# Altium footprint library PcbLib1.PcbLib: 1009 footprints (part 62 of 64)
Each footprint in its own frame and in the unit in brackets; x right, y up, seen from the top. Pads: shape width x height; smd on the part's side, far side on the other; paste and mask are expansions set on the pad; w line width, h text height; cw(c..) or ccw(c..) is an arc to the next point about the centre after c.
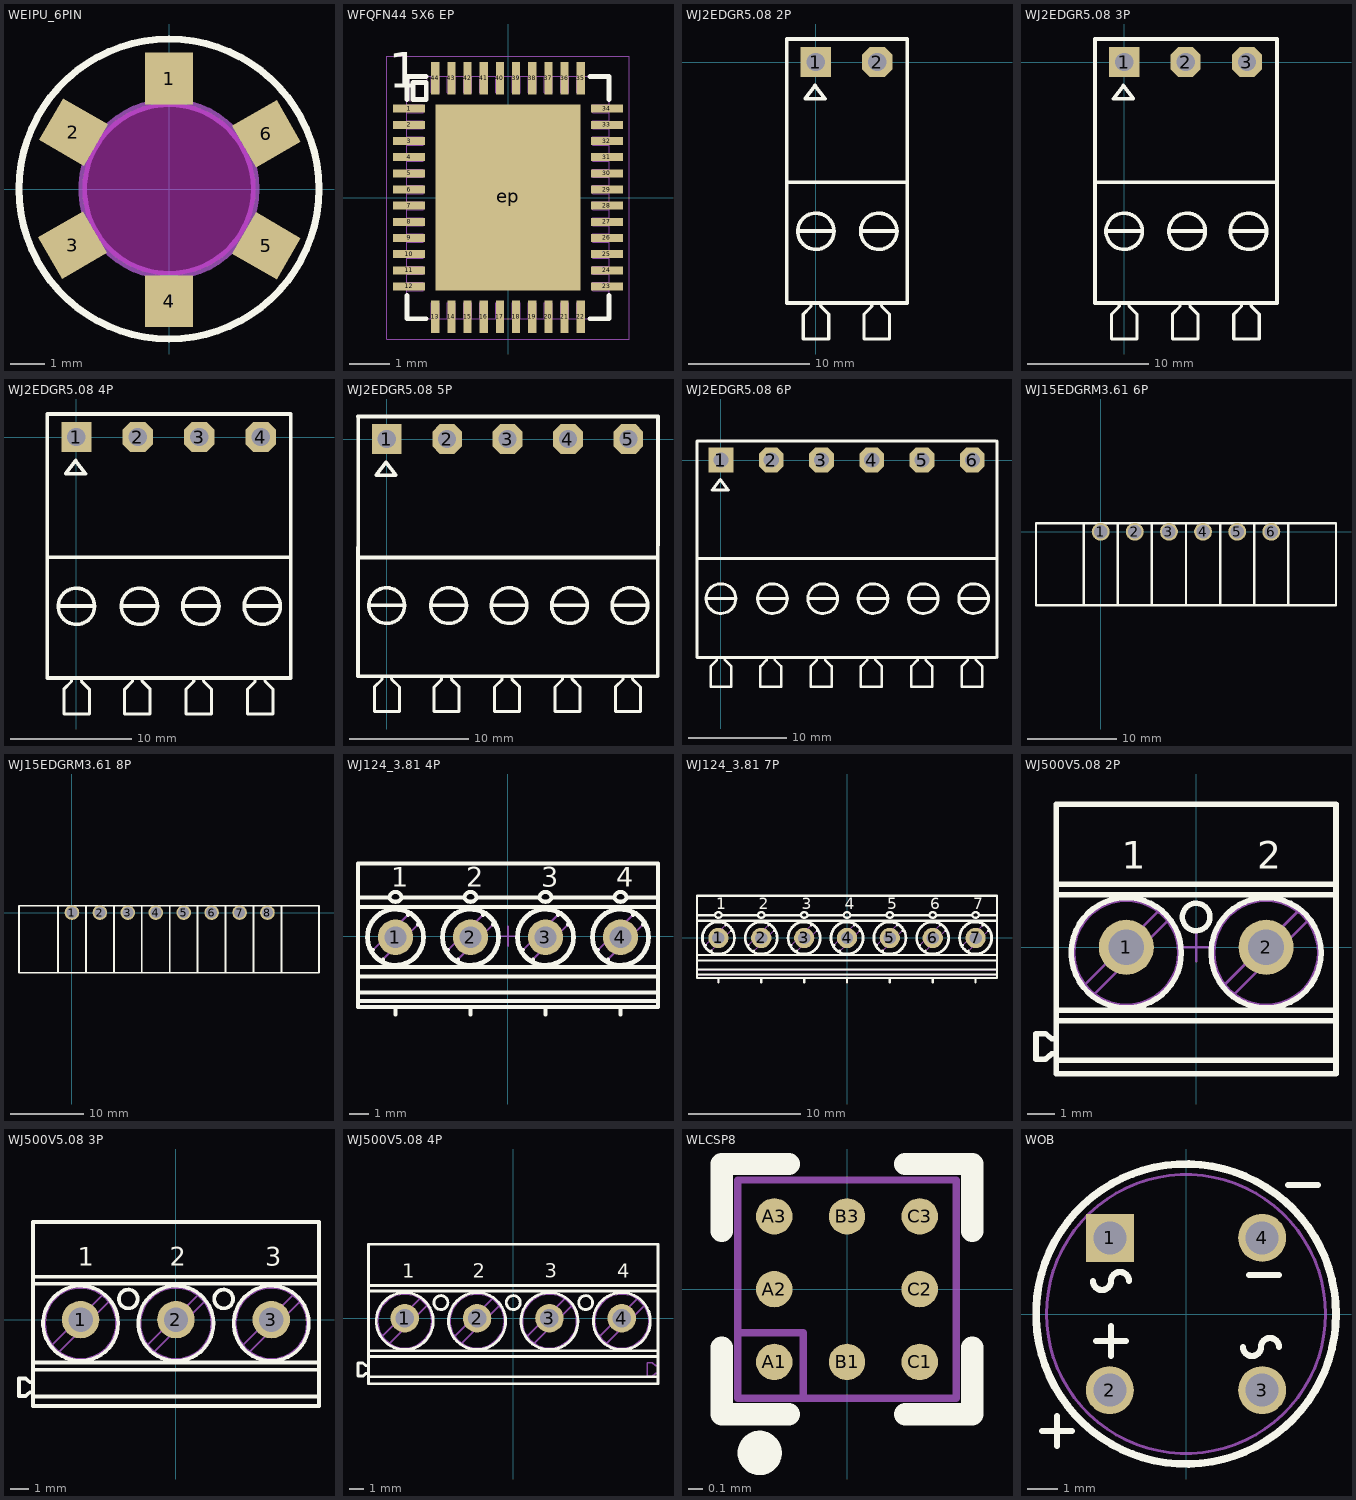
[diagram p61: the footprints below, top view; thin cyan lines are the x and y axes]

## WEIPU_6PIN [mm]
pads (6):
  rect 1.4x1.5 smd mask+0.051: 1(0,3.2) 4(0,-3.251)
  rect 1.4x1.5 smd rot 60 mask+0.051: 2(-2.769,1.651) 5(2.819,-1.651)
  rect 1.4x1.5 smd rot 120 mask+0.051: 3(-2.794,-1.626) 6(2.819,1.6)
Top Overlay:
  circle w0.203: c0,0 r4.347
Keep-Out Layer:
  board cut-out: 0,-2.5 -0.246,-2.5 -0.729,-2.404 -1.184,-2.215 -1.594,-1.942 -1.942,-1.594 -2.215,-1.184 -2.404,-0.729 -2.5,-0.246 -2.5,0 -2.5,0.246 -2.404,0.729 -2.215,1.184 -1.942,1.594 -1.594,1.942 -1.184,2.215 -0.729,2.404 -0.246,2.5 0,2.5 0.246,2.5 0.729,2.404 1.184,2.215 1.594,1.942 1.942,1.594 2.215,1.184 2.404,0.729 2.5,0.246 2.5,0 2.5,-0.246 2.404,-0.729 2.215,-1.184 1.942,-1.594 1.594,-1.942 1.184,-2.215 0.729,-2.404 0.246,-2.5
Mechanical 1:
  circle w0.254: c0,0 r2.5

## WFQFN44 5X6 EP [mm]
pads (45):
  rect 0.8x0.2 smd mask+0.05: 1(-2.45,2.2) 2(-2.45,1.8) 3(-2.45,1.4) 4(-2.45,1) 5(-2.45,0.6) 6(-2.45,0.2) 7(-2.45,-0.2) 8(-2.45,-0.6) 9(-2.45,-1) 10(-2.45,-1.4) 11(-2.45,-1.8) 12(-2.45,-2.2) 23(2.45,-2.2) 24(2.45,-1.8) 25(2.45,-1.4) 26(2.45,-1) 27(2.45,-0.6) 28(2.45,-0.2) 29(2.45,0.2) 30(2.45,0.6) 31(2.45,1) 32(2.45,1.4) 33(2.45,1.8) 34(2.45,2.2)
  rect 0.2x0.8 smd mask+0.05: 13(-1.8,-2.95) 14(-1.4,-2.95) 15(-1,-2.95) 16(-0.6,-2.95) 17(-0.2,-2.95) 18(0.2,-2.95) 19(0.6,-2.95) 20(1,-2.95) 21(1.4,-2.95) 22(1.8,-2.95) 35(1.8,2.95) 36(1.4,2.95) 37(1,2.95) 38(0.6,2.95) 39(0.2,2.95) 40(-0.2,2.95) 41(-0.6,2.95) 42(-1,2.95) 43(-1.4,2.95) 44(-1.8,2.95)
  rect 3.6x4.6 smd paste-1.8 mask+0.05: ep(0,0)
Top Overlay:
  lines w0.12: -2.5,-2.425 -2.5,-3 -2.025,-3 ; -2.5,2.425 -2.5,3 -2.025,3 ; 2.025,-3 2.5,-3 2.5,-2.425 ; 2.025,3 2.5,3 2.5,2.425 ; -2.35,2.425 -2.35,2.85 -2.025,2.85 -2.025,2.425 -2.35,2.425
  text "1" at -2.95,2.425 h1.5
Top Paste:
  rectangle: -0.5,0.1 -0.1,0.475
  rectangle: -0.5,0.675 -0.1,1.05
  rectangle: -0.5,1.25 -0.1,1.625
  rectangle: -0.5,1.825 -0.1,2.2
  rectangle: -1.1,1.825 -0.7,2.2
  rectangle: -1.1,1.25 -0.7,1.625
  rectangle: -1.1,0.675 -0.7,1.05
  rectangle: -1.1,0.1 -0.7,0.475
  rectangle: -1.7,1.825 -1.3,2.2
  rectangle: -1.7,1.25 -1.3,1.625
  rectangle: -1.7,0.675 -1.3,1.05
  rectangle: -1.7,0.1 -1.3,0.475
  rectangle: 0.1,0.1 0.5,0.475
  rectangle: 0.1,0.675 0.5,1.05
  rectangle: 0.1,1.25 0.5,1.625
  rectangle: 0.1,1.825 0.5,2.2
  rectangle: 0.7,0.1 1.1,0.475
  rectangle: 0.7,0.675 1.1,1.05
  rectangle: 0.7,1.25 1.1,1.625
  rectangle: 0.7,1.825 1.1,2.2
  rectangle: 1.3,1.825 1.7,2.2
  rectangle: 1.3,1.25 1.7,1.625
  rectangle: 1.3,0.675 1.7,1.05
  rectangle: 1.3,0.1 1.7,0.475
  rectangle: -1.7,-2.2 -1.3,-1.825
  rectangle: -1.7,-1.625 -1.3,-1.25
  rectangle: -1.7,-1.05 -1.3,-0.675
  rectangle: -1.7,-0.475 -1.3,-0.1
  rectangle: -1.1,-2.2 -0.7,-1.825
  rectangle: -1.1,-1.625 -0.7,-1.25
  rectangle: -1.1,-1.05 -0.7,-0.675
  rectangle: -1.1,-0.475 -0.7,-0.1
  rectangle: -0.5,-0.475 -0.1,-0.1
  rectangle: -0.5,-1.05 -0.1,-0.675
  rectangle: -0.5,-1.625 -0.1,-1.25
  rectangle: -0.5,-2.2 -0.1,-1.825
  rectangle: 0.1,-2.2 0.5,-1.825
  rectangle: 0.1,-1.625 0.5,-1.25
  rectangle: 0.1,-1.05 0.5,-0.675
  rectangle: 0.1,-0.475 0.5,-0.1
  rectangle: 0.7,-2.2 1.1,-1.825
  rectangle: 0.7,-1.625 1.1,-1.25
  rectangle: 0.7,-1.05 1.1,-0.675
  rectangle: 0.7,-0.475 1.1,-0.1
  rectangle: 1.3,-0.475 1.7,-0.1
  rectangle: 1.3,-1.05 1.7,-0.675
  rectangle: 1.3,-1.625 1.7,-1.25
  rectangle: 1.3,-2.2 1.7,-1.825
Mechanical 14:
  lines w0.01: -2.5,-2.3 -2.1,-2.3 -2.1,-2.1 -2.5,-2.1 ; -2.5,-1.9 -2.1,-1.9 -2.1,-1.7 -2.5,-1.7 ; -2.5,-1.5 -2.1,-1.5 -2.1,-1.3 -2.5,-1.3 ; -2.5,-1.1 -2.1,-1.1 -2.1,-0.9 -2.5,-0.9 ; -2.5,-0.7 -2.1,-0.7 -2.1,-0.5 -2.5,-0.5 ; -2.5,-0.3 -2.1,-0.3 -2.1,-0.1 -2.5,-0.1 ; -2.5,0.1 -2.1,0.1 -2.1,0.3 -2.5,0.3 ; -2.5,0.5 -2.1,0.5 -2.1,0.7 -2.5,0.7 ; -2.5,0.9 -2.1,0.9 -2.1,1.1 -2.5,1.1 ; -2.5,1.3 -2.1,1.3 -2.1,1.5 -2.5,1.5 ; -2.5,1.7 -2.1,1.7 -2.1,1.9 -2.5,1.9 ; -2.5,2.1 -2.1,2.1 -2.1,2.3 -2.5,2.3 ; -1.9,-3 -1.9,-2.6 -1.7,-2.6 -1.7,-3 ; -1.9,3 -1.9,2.6 -1.7,2.6 -1.7,3 ; -1.5,-3 -1.5,-2.6 -1.3,-2.6 -1.3,-3 ; -1.5,3 -1.5,2.6 -1.3,2.6 -1.3,3 ; -1.1,-3 -1.1,-2.6 -0.9,-2.6 -0.9,-3 ; -1.1,3 -1.1,2.6 -0.9,2.6 -0.9,3 ; -0.7,-3 -0.7,-2.6 -0.5,-2.6 -0.5,-3 ; -0.7,3 -0.7,2.6 -0.5,2.6 -0.5,3 ; -0.3,-3 -0.3,-2.6 -0.1,-2.6 -0.1,-3 ; -0.3,3 -0.3,2.6 -0.1,2.6 -0.1,3 ; 0.1,-3 0.1,-2.6 0.3,-2.6 0.3,-3 ; 0.1,3 0.1,2.6 0.3,2.6 0.3,3 ; 0.5,-3 0.5,-2.6 0.7,-2.6 0.7,-3 ; 0.5,3 0.5,2.6 0.7,2.6 0.7,3 ; 0.9,-3 0.9,-2.6 1.1,-2.6 1.1,-3 ; 0.9,3 0.9,2.6 1.1,2.6 1.1,3 ; 1.3,-3 1.3,-2.6 1.5,-2.6 1.5,-3 ; 1.3,3 1.3,2.6 1.5,2.6 1.5,3 ; 1.7,-3 1.7,-2.6 1.9,-2.6 1.9,-3 ; 1.7,3 1.7,2.6 1.9,2.6 1.9,3 ; 2.5,-2.3 2.1,-2.3 2.1,-2.1 2.5,-2.1 ; 2.5,-1.9 2.1,-1.9 2.1,-1.7 2.5,-1.7 ; 2.5,-1.5 2.1,-1.5 2.1,-1.3 2.5,-1.3 ; 2.5,-1.1 2.1,-1.1 2.1,-0.9 2.5,-0.9 ; 2.5,-0.7 2.1,-0.7 2.1,-0.5 2.5,-0.5 ; 2.5,-0.3 2.1,-0.3 2.1,-0.1 2.5,-0.1 ; 2.5,0.1 2.1,0.1 2.1,0.3 2.5,0.3 ; 2.5,0.5 2.1,0.5 2.1,0.7 2.5,0.7 ; 2.5,0.9 2.1,0.9 2.1,1.1 2.5,1.1 ; 2.5,1.3 2.1,1.3 2.1,1.5 2.5,1.5 ; 2.5,1.7 2.1,1.7 2.1,1.9 2.5,1.9 ; 2.5,2.1 2.1,2.1 2.1,2.3 2.5,2.3 ; -2.5,-3 -2.5,3 2.5,3 2.5,-3 -2.5,-3 ; -2.45,2.4 -2,2.4 -2,2.95 -2.45,2.95 -2.45,2.4 ; -1.75,-2.25 1.75,-2.25 1.75,2.25 -1.5,2.25 -1.75,2 -1.75,-2.25
  text "ep" at -0.7,0.625 h1.5
  text "44" at -2.04,3.05 h0.5
  text "35" at 1.58,3.06 h0.5
  text "34" at 2.525,2.05 h0.5
  text "23" at 2.525,-2.35 h0.5
  text "22" at 1.56,-3.36 h0.5
  text "13" at -2.02,-3.36 h0.5
  text "12" at -2.95,-2.375 h0.5
  text "1" at -2.675,2.05 h0.5
  text "'.Designator'" at -2,-0.5 h0.75
Mechanical 16:
  lines w0.01: -3,-3.5 -2.975,-3.5 3,-3.5 3,3.5 -3,3.5 -3,2.35 -3,-3.5
3D body: height 0.02, standoff 0, extent -1.725,-2.225 1.725,2.225
3D body: height 0.81, standoff 0.8, extent -2.45,2.4 -2,2.95
3D body: height 0.02, standoff 0, extent -1.9,2.6 -1.7,3
3D body: height 0.02, standoff 0, extent -1.5,2.6 -1.3,3
3D body: height 0.02, standoff 0, extent -1.1,2.6 -0.9,3
3D body: height 0.02, standoff 0, extent -0.7,2.6 -0.5,3
3D body: height 0.02, standoff 0, extent -0.3,2.6 -0.1,3
3D body: height 0.02, standoff 0, extent 0.1,2.6 0.3,3
3D body: height 0.02, standoff 0, extent 0.5,2.6 0.7,3
3D body: height 0.02, standoff 0, extent 0.9,2.6 1.1,3
3D body: height 0.02, standoff 0, extent 1.3,2.6 1.5,3
3D body: height 0.02, standoff 0, extent 1.7,2.6 1.9,3
3D body: height 0.02, standoff 0, extent 2.1,2.1 2.5,2.3
3D body: height 0.02, standoff 0, extent 2.1,1.7 2.5,1.9
3D body: height 0.02, standoff 0, extent 2.1,1.3 2.5,1.5
3D body: height 0.02, standoff 0, extent 2.1,0.9 2.5,1.1
3D body: height 0.02, standoff 0, extent 2.1,0.5 2.5,0.7
3D body: height 0.02, standoff 0, extent 2.1,0.1 2.5,0.3
3D body: height 0.02, standoff 0, extent 2.1,-0.3 2.5,-0.1
3D body: height 0.02, standoff 0, extent 2.1,-0.7 2.5,-0.5
3D body: height 0.02, standoff 0, extent 2.1,-1.1 2.5,-0.9
3D body: height 0.02, standoff 0, extent 2.1,-1.5 2.5,-1.3
3D body: height 0.02, standoff 0, extent 2.1,-1.9 2.5,-1.7
3D body: height 0.02, standoff 0, extent 2.1,-2.3 2.5,-2.1
3D body: height 0.02, standoff 0, extent 1.7,-3 1.9,-2.6
3D body: height 0.02, standoff 0, extent 1.3,-3 1.5,-2.6
3D body: height 0.02, standoff 0, extent 0.9,-3 1.1,-2.6
3D body: height 0.02, standoff 0, extent 0.5,-3 0.7,-2.6
3D body: height 0.02, standoff 0, extent 0.1,-3 0.3,-2.6
3D body: height 0.02, standoff 0, extent -0.3,-3 -0.1,-2.6
3D body: height 0.02, standoff 0, extent -0.7,-3 -0.5,-2.6
3D body: height 0.02, standoff 0, extent -1.1,-3 -0.9,-2.6
3D body: height 0.02, standoff 0, extent -1.5,-3 -1.3,-2.6
3D body: height 0.02, standoff 0, extent -1.9,-3 -1.7,-2.6
3D body: height 0.02, standoff 0, extent -2.5,-2.3 -2.1,-2.1
3D body: height 0.02, standoff 0, extent -2.5,-1.9 -2.1,-1.7
3D body: height 0.02, standoff 0, extent -2.5,-1.5 -2.1,-1.3
3D body: height 0.02, standoff 0, extent -2.5,-1.1 -2.1,-0.9
3D body: height 0.02, standoff 0, extent -2.5,-0.7 -2.1,-0.5
3D body: height 0.02, standoff 0, extent -2.5,-0.3 -2.1,-0.1
3D body: height 0.02, standoff 0, extent -2.5,0.1 -2.1,0.3
3D body: height 0.02, standoff 0, extent -2.5,0.5 -2.1,0.7
3D body: height 0.02, standoff 0, extent -2.5,0.9 -2.1,1.1
3D body: height 0.02, standoff 0, extent -2.5,1.3 -2.1,1.5
3D body: height 0.02, standoff 0, extent -2.5,1.7 -2.1,1.9
3D body: height 0.02, standoff 0, extent -2.5,2.1 -2.1,2.3
3D body: height 0.8, standoff 0.02, extent -2.5,-3 2.5,3

## WJ2EDGR5.08 2P [mm]
height 12.7
pads (2):
  rect 2.5x2.5 hole 1.524: 1(0,0)
  oct 2.5x2.5 hole 1.524: 2(5.08,0)
Top Overlay:
  circle w0.305: c0,-14 r1.5
  circle w0.305: c5.207,-14 r1.5
  lines w0.254: -0.406,-19.99 -0.406,-20.218 -1.041,-20.853 -1.041,-22.911 1.067,-22.911 1.067,-20.853 0.406,-20.193 0.406,-19.964 0.356,-19.914 ; 4.623,-19.99 4.623,-20.218 3.988,-20.853 3.988,-22.911 6.096,-22.911 6.096,-20.853 5.436,-20.193 5.436,-19.964 5.385,-19.914
  lines w0.305: -2.413,1.905 7.518,1.905 ; -2.411,1.905 -2.417,-19.939 7.565,-19.939 7.571,1.905 ; -2.362,-9.957 7.569,-9.957 ; -1.397,-13.97 1.397,-13.97 ; 3.81,-13.97 6.604,-13.97 ; -0.889,-3.048 -0.064,-1.947 0.762,-3.048 0.508,-3.048 -0.889,-3.048
3D body "User Library-MSTB 2,5-2-G-5,08 1770711.STEP": height 8.7, standoff -3.4, extent -2.515,-10.04 7.645,1.962

## WJ2EDGR5.08 3P [mm]
height 12.7
pads (3):
  rect 2.5x2.5 hole 1.524: 1(0,0)
  oct 2.5x2.5 hole 1.524: 2(5.08,0) 3(10.16,0)
Top Overlay:
  circle w0.305: c10.287,-14 r1.5
  circle w0.305: c0,-14 r1.5
  circle w0.305: c5.207,-14 r1.5
  lines w0.254: -0.406,-19.99 -0.406,-20.218 -1.041,-20.853 -1.041,-22.911 1.067,-22.911 1.067,-20.853 0.406,-20.193 0.406,-19.964 0.356,-19.914 ; 4.623,-19.99 4.623,-20.218 3.988,-20.853 3.988,-22.911 6.096,-22.911 6.096,-20.853 5.436,-20.193 5.436,-19.964 5.385,-19.914 ; 9.703,-19.99 9.703,-20.218 9.068,-20.853 9.068,-22.911 11.176,-22.911 11.176,-20.853 10.516,-20.193 10.516,-19.964 10.465,-19.914
  lines w0.305: -2.413,1.905 12.651,1.905 12.645,-19.939 -2.417,-19.939 -2.411,1.905 ; -2.388,-9.957 12.649,-9.957 ; -1.397,-13.97 1.397,-13.97 ; 3.81,-13.97 6.604,-13.97 ; 8.89,-13.97 11.684,-13.97 ; -0.889,-3.048 -0.064,-1.947 0.762,-3.048 0.508,-3.048 -0.889,-3.048
3D body "User Library-MSTB 2,5-3-G-5,08 1759020.SLDPRT": height 8.7, standoff -3.4, extent -2.515,-10.04 12.725,1.962

## WJ2EDGR5.08 4P [mm]
height 12.7
pads (4):
  rect 2.5x2.5 hole 1.524: 1(0,0)
  oct 2.5x2.5 hole 1.524: 2(5.08,0) 3(10.16,0) 4(15.24,0)
Top Overlay:
  circle w0.305: c15.367,-14 r1.5
  circle w0.305: c5.207,-14 r1.5
  circle w0.305: c0,-14 r1.5
  circle w0.305: c10.287,-14 r1.5
  lines w0.254: -0.406,-19.99 -0.406,-20.218 -1.041,-20.853 -1.041,-22.911 1.067,-22.911 1.067,-20.853 0.406,-20.193 0.406,-19.964 0.356,-19.914 ; 4.623,-19.99 4.623,-20.218 3.988,-20.853 3.988,-22.911 6.096,-22.911 6.096,-20.853 5.436,-20.193 5.436,-19.964 5.385,-19.914 ; 9.703,-19.99 9.703,-20.218 9.068,-20.853 9.068,-22.911 11.176,-22.911 11.176,-20.853 10.516,-20.193 10.516,-19.964 10.465,-19.914 ; 14.783,-19.99 14.783,-20.218 14.148,-20.853 14.148,-22.911 16.256,-22.911 16.256,-20.853 15.596,-20.193 15.596,-19.964 15.545,-19.914
  lines w0.305: -2.413,1.905 17.679,1.905 ; -2.411,1.905 -2.417,-19.939 17.673,-19.939 ; -2.388,-9.957 17.728,-9.957 ; -1.397,-13.97 1.397,-13.97 ; 3.81,-13.97 6.604,-13.97 ; 8.89,-13.97 11.684,-13.97 ; 13.97,-13.97 16.764,-13.97 ; 17.725,-19.939 17.731,1.905 ; -0.889,-3.048 0.508,-3.048 0.762,-3.048 -0.064,-1.947 -0.889,-3.048
3D body "User Library-MSTB 2,5-4-G-5,08 1759033.STEP": height 8.7, standoff -3.4, extent -2.515,-10.04 17.805,1.962

## WJ2EDGR5.08 5P [mm]
height 12.7
pads (5):
  rect 2.5x2.5 hole 1.524: 1(0,0)
  oct 2.5x2.5 hole 1.524: 2(5.08,0) 3(10.16,0) 4(15.24,0) 5(20.32,0)
Top Overlay:
  circle w0.305: c10.287,-14 r1.5
  circle w0.305: c0,-14 r1.5
  circle w0.305: c5.207,-14 r1.5
  circle w0.305: c15.367,-14 r1.5
  circle w0.305: c20.447,-14 r1.5
  lines w0.254: -0.406,-19.99 -0.406,-20.218 -1.041,-20.853 -1.041,-22.911 1.067,-22.911 1.067,-20.853 0.406,-20.193 0.406,-19.964 0.356,-19.914 ; 4.623,-19.99 4.623,-20.218 3.988,-20.853 3.988,-22.911 6.096,-22.911 6.096,-20.853 5.436,-20.193 5.436,-19.964 5.385,-19.914 ; 9.703,-19.99 9.703,-20.218 9.068,-20.853 9.068,-22.911 11.176,-22.911 11.176,-20.853 10.516,-20.193 10.516,-19.964 10.465,-19.914 ; 14.783,-19.99 14.783,-20.218 14.148,-20.853 14.148,-22.911 16.256,-22.911 16.256,-20.853 15.596,-20.193 15.596,-19.964 15.545,-19.914 ; 19.863,-19.99 19.863,-20.218 19.228,-20.853 19.228,-22.911 21.336,-22.911 21.336,-20.853 20.676,-20.193 20.676,-19.964 20.625,-19.914
  lines w0.305: -2.413,1.905 22.811,1.905 22.805,-19.939 -2.417,-19.939 -2.411,1.905 ; -2.388,-9.957 22.682,-9.957 ; -1.397,-13.97 1.397,-13.97 ; 3.81,-13.97 6.604,-13.97 ; 8.89,-13.97 11.684,-13.97 ; 13.97,-13.97 16.764,-13.97 ; 19.05,-13.97 21.844,-13.97 ; -0.889,-3.048 -0.064,-1.947 0.762,-3.048 0.508,-3.048 -0.889,-3.048
3D body "User Library-MSTB 2,5-5-G-5,08 1759046.STEP": height 8.7, standoff -3.4, extent -2.515,-10.04 22.885,1.962

## WJ2EDGR5.08 6P [mm]
height 12.7
pads (6):
  rect 2.5x2.5 hole 1.524: 1(0,0)
  oct 2.5x2.5 hole 1.524: 2(5.08,0) 3(10.16,0) 4(15.24,0) 5(20.32,0) 6(25.4,0)
Top Overlay:
  circle w0.305: c20.447,-14 r1.5
  circle w0.305: c15.367,-14 r1.5
  circle w0.305: c5.207,-14 r1.5
  circle w0.305: c0,-14 r1.5
  circle w0.305: c10.287,-14 r1.5
  circle w0.305: c25.527,-14 r1.5
  lines w0.254: -0.406,-19.99 -0.406,-20.218 -1.041,-20.853 -1.041,-22.911 1.067,-22.911 1.067,-20.853 0.406,-20.193 0.406,-19.964 0.356,-19.914 ; 4.623,-19.99 4.623,-20.218 3.988,-20.853 3.988,-22.911 6.096,-22.911 6.096,-20.853 5.436,-20.193 5.436,-19.964 5.385,-19.914 ; 9.703,-19.99 9.703,-20.218 9.068,-20.853 9.068,-22.911 11.176,-22.911 11.176,-20.853 10.516,-20.193 10.516,-19.964 10.465,-19.914 ; 14.783,-19.99 14.783,-20.218 14.148,-20.853 14.148,-22.911 16.256,-22.911 16.256,-20.853 15.596,-20.193 15.596,-19.964 15.545,-19.914 ; 19.863,-19.99 19.863,-20.218 19.228,-20.853 19.228,-22.911 21.336,-22.911 21.336,-20.853 20.676,-20.193 20.676,-19.964 20.625,-19.914 ; 24.943,-19.99 24.943,-20.218 24.308,-20.853 24.308,-22.911 26.416,-22.911 26.416,-20.853 25.756,-20.193 25.756,-19.964 25.705,-19.914
  lines w0.305: -2.413,1.905 27.764,1.905 ; -2.411,1.905 -2.417,-19.939 27.758,-19.939 ; -2.388,-9.957 27.788,-9.957 ; -1.397,-13.97 1.397,-13.97 ; 3.81,-13.97 6.604,-13.97 ; 8.89,-13.97 11.684,-13.97 ; 13.97,-13.97 16.764,-13.97 ; 19.05,-13.97 21.844,-13.97 ; 24.13,-13.97 26.924,-13.97 ; 27.885,-19.939 27.891,1.905 ; -0.889,-3.048 0.508,-3.048 0.762,-3.048 -0.064,-1.947 -0.889,-3.048
3D body "User Library-MSTB 2,5-6-G-5,08 1759059.STEP": height 8.7, standoff -3.4, extent -2.515,-10.04 27.965,1.962

## WJ15EDGRM3.61 6P [mm]
pads (6):
  round 2 hole 1.5: 1(0,0) 2(3.81,0) 3(7.62,0) 4(11.43,0) 5(15.24,0) 6(19.05,0)
Top Overlay:
  lines w0.254: -7.225,0.896 -7.225,-8.204 26.275,-8.204 26.275,0.896 ; -7.225,0.94 -0.025,0.94 26.275,0.94 ; -1.905,-8.204 -1.905,0.889 ; 1.905,-8.179 1.905,0.914 ; 5.715,-8.179 5.715,0.94 ; 9.525,-8.128 9.525,0.787 ; 13.335,-8.103 13.335,0.864 ; 17.145,-8.179 17.145,0.838 ; 20.955,-8.153 20.955,0.889
3D body: height 0.25, standoff 0, extent 0.61,3.988 0.61,3.988

## WJ15EDGRM3.61 8P [mm]
pads (8):
  round 2 hole 1.5: 1(0,0) 2(3.81,0) 3(7.62,0) 4(11.43,0) 5(15.24,0) 6(19.05,0) 7(22.86,0) 8(26.67,0)
Top Overlay:
  lines w0.254: -7.225,0.896 -7.225,-8.204 33.68,-8.204 33.698,-8.187 33.698,0.922 33.68,0.94 -0.025,0.94 -7.225,0.94 ; -1.905,-8.204 -1.905,0.889 ; 1.905,-8.179 1.905,0.914 ; 5.715,-8.179 5.715,0.94 ; 9.525,-8.128 9.525,0.787 ; 13.335,-8.103 13.335,0.864 ; 17.145,-8.179 17.145,0.838 ; 20.955,-8.153 20.955,0.889 ; 24.765,-8.153 24.765,0.914 ; 28.575,-8.179 28.575,0.914
3D body: height 0.25, standoff 0, extent 0.61,3.988 0.61,3.988
3D body "38147.stp": height 7.25, standoff -3.4, extent -7.176,-8.235 33.694,1.065

## WJ124_3.81 4P [mm] "PCB Terminal Block, Pitch 3.81mm, 4 Positions, Screw Connection"
height 8.5
pads (4):
  round 1.8 hole 1.1: 1(-5.715,-0.05) 2(-1.905,-0.05) 3(1.905,-0.05) 4(5.715,-0.05)
Top Overlay:
  circle w0.2: c1.905,-0.05 r1.45
  circle w0.2: c5.715,-0.05 r1.45
  circle w0.2: c-1.905,-0.05 r1.45
  circle w0.2: c-5.715,-0.05 r1.45
  circle w0.2: c5.715,-0.05 r1.4
  circle w0.2: c1.905,-0.05 r1.4
  circle w0.2: c-1.905,-0.05 r1.4
  circle w0.2: c-5.715,-0.05 r1.4
  lines w0.2: -7.62,-3.3 7.62,-3.3 ; -7.62,-2.861 7.62,-2.861 ; -7.62,-2.049 7.62,-2.049 ; -7.62,-1.566 7.62,-1.566 ; -7.62,1.487 7.62,1.487 ; -7.62,1.962 -6.017,1.962 ; -6.921,-0.761 -6.848,-0.688 ; -6.426,-1.256 -6.353,-1.183 ; -5.715,-3.981 -5.715,-3.6 ; -5.413,1.962 -2.207,1.962 ; -5.077,1.083 -5.004,1.156 ; -4.582,0.588 -4.509,0.661 ; -3.111,-0.761 -3.038,-0.688 ; -2.616,-1.256 -2.543,-1.183 ; -1.905,-3.981 -1.905,-3.6 ; -1.603,1.962 1.603,1.962 ; -1.267,1.083 -1.194,1.156 ; -0.772,0.588 -0.699,0.661 ; 0.699,-0.761 0.772,-0.688 ; 1.194,-1.256 1.267,-1.183 ; 1.905,-3.981 1.905,-3.6 ; 2.207,1.962 5.413,1.962 ; 2.543,1.083 2.616,1.156 ; 3.038,0.588 3.111,0.661 ; 4.509,-0.761 4.582,-0.688 ; 5.004,-1.256 5.077,-1.183 ; 5.715,-3.981 5.715,-3.6 ; 6.017,1.962 7.62,1.962 ; 6.353,1.083 6.426,1.156 ; 6.848,0.588 6.921,0.661 ; -7.62,-3.6 7.62,-3.6 7.62,3.7 -7.62,3.7 -7.62,-3.6 ; -6.016,1.923 cw(c-5.715,1.948) -5.414,1.923 cw(c-5.715,2.098) -6.016,1.923 ; -2.206,1.923 cw(c-1.905,1.948) -1.604,1.923 cw(c-1.905,2.098) -2.206,1.923 ; 1.604,1.923 cw(c1.905,1.948) 2.206,1.923 cw(c1.905,2.098) 1.604,1.923 ; 5.414,1.923 cw(c5.715,1.948) 6.016,1.923 cw(c5.715,2.098) 5.414,1.923
  text "1" at -5.925,2.525 h1
  text "2" at -2.115,2.525 h1
  text "3" at 1.695,2.525 h1
  text "4" at 5.505,2.525 h1
Mechanical 8:
  lines w0.1: -6.215,-0.05 -5.715,-0.05 ; -5.715,-0.55 -5.715,-0.05 ; -5.715,0.45 -5.715,-0.05 ; -5.215,-0.05 -5.715,-0.05 ; -2.405,-0.05 -1.905,-0.05 ; -1.905,-0.55 -1.905,-0.05 ; -1.905,0.45 -1.905,-0.05 ; -1.405,-0.05 -1.905,-0.05 ; -0.5,0 0,0 ; 0,-0.5 0,0 ; 0,0.5 0,0 ; 0.5,0 0,0 ; 1.405,-0.05 1.905,-0.05 ; 1.905,-0.55 1.905,-0.05 ; 1.905,0.45 1.905,-0.05 ; 2.405,-0.05 1.905,-0.05 ; 5.215,-0.05 5.715,-0.05 ; 5.715,-0.55 5.715,-0.05 ; 5.715,0.45 5.715,-0.05 ; 6.215,-0.05 5.715,-0.05
Mechanical 14:
  circle w0.1: c1.905,-0.05 r1.45
  circle w0.1: c5.715,-0.05 r1.45
  circle w0.1: c-1.905,-0.05 r1.45
  circle w0.1: c-5.715,-0.05 r1.45
  circle w0.1: c5.715,-0.05 r1.4
  circle w0.1: c1.905,-0.05 r1.4
  circle w0.1: c-1.905,-0.05 r1.4
  circle w0.1: c-5.715,-0.05 r1.4
  lines w0.1: -7.62,-3.3 7.62,-3.3 ; -7.62,-2.861 7.62,-2.861 ; -7.62,-2.049 7.62,-2.049 ; -7.62,-1.566 7.62,-1.566 ; -7.62,1.487 7.62,1.487 ; -7.62,1.962 -6.017,1.962 ; -6.921,-0.761 -5.004,1.156 ; -6.426,-1.256 -4.509,0.661 ; -5.715,-3.981 -5.715,-3.6 ; -5.413,1.962 -2.207,1.962 ; -3.111,-0.761 -1.194,1.156 ; -2.616,-1.256 -0.699,0.661 ; -1.905,-3.981 -1.905,-3.6 ; -1.603,1.962 1.603,1.962 ; 0.699,-0.761 2.616,1.156 ; 1.194,-1.256 3.111,0.661 ; 1.905,-3.981 1.905,-3.6 ; 2.207,1.962 5.413,1.962 ; 4.509,-0.761 6.426,1.156 ; 5.004,-1.256 6.921,0.661 ; 5.715,-3.981 5.715,-3.6 ; 6.017,1.962 7.62,1.962 ; -7.62,-3.6 7.62,-3.6 7.62,3.7 -7.62,3.7 -7.62,-3.6 ; -6.016,1.923 cw(c-5.715,1.948) -5.414,1.923 cw(c-5.715,2.098) -6.016,1.923 ; -2.206,1.923 cw(c-1.905,1.948) -1.604,1.923 cw(c-1.905,2.098) -2.206,1.923 ; 1.604,1.923 cw(c1.905,1.948) 2.206,1.923 cw(c1.905,2.098) 1.604,1.923 ; 5.414,1.923 cw(c5.715,1.948) 6.016,1.923 cw(c5.715,2.098) 5.414,1.923
  text "1" at -5.925,2.525 h1
  text "2" at -2.115,2.525 h1
  text "3" at 1.695,2.525 h1
  text "4" at 5.505,2.525 h1
3D body "PHOENIX_1727036.stp": height 8.5, standoff -3.5, extent -7.62,-3.6 7.62,3.7

## WJ124_3.81 7P [mm] "PCB Terminal Block, Pitch 3.81mm, 7 Positions, Screw Connection"
height 8.5
pads (7):
  round 1.8 hole 1.1: 1(-11.43,0) 2(-7.62,0) 3(-3.81,0) 4(0,0) 5(3.81,0) 6(7.62,0) 7(11.43,0)
Top Overlay:
  circle w0.2: c-11.43,0 r1.45
  circle w0.2: c-11.43,0 r1.4
  circle w0.2: c-7.62,0 r1.45
  circle w0.2: c-7.62,0 r1.4
  circle w0.2: c-3.81,0 r1.45
  circle w0.2: c-3.81,0 r1.4
  circle w0.2: c0,0 r1.45
  circle w0.2: c0,0 r1.4
  circle w0.2: c3.81,0 r1.45
  circle w0.2: c3.81,0 r1.4
  circle w0.2: c7.62,0 r1.45
  circle w0.2: c7.62,0 r1.4
  circle w0.2: c11.43,0 r1.45
  circle w0.2: c11.43,0 r1.4
  lines w0.2: -13.335,-3.25 13.335,-3.25 ; -13.335,-2.811 13.335,-2.811 ; -13.335,-1.999 13.335,-1.999 ; -13.335,-1.516 13.335,-1.516 ; -13.335,1.537 13.335,1.537 ; -13.335,2.012 -11.732,2.012 ; -12.636,-0.711 -12.563,-0.638 ; -12.141,-1.206 -12.068,-1.133 ; -11.43,-3.931 -11.43,-3.55 ; -11.128,2.012 -7.922,2.012 ; -10.792,1.133 -10.719,1.206 ; -10.297,0.638 -10.224,0.711 ; -8.826,-0.711 -8.753,-0.638 ; -8.331,-1.206 -8.258,-1.133 ; -7.62,-3.931 -7.62,-3.55 ; -7.318,2.012 -4.112,2.012 ; -6.982,1.133 -6.909,1.206 ; -6.487,0.638 -6.414,0.711 ; -5.016,-0.711 -4.943,-0.638 ; -4.521,-1.206 -4.448,-1.133 ; -3.81,-3.931 -3.81,-3.55 ; -3.508,2.012 -0.302,2.012 ; -3.172,1.133 -3.099,1.206 ; -2.677,0.638 -2.604,0.711 ; -1.206,-0.711 -1.133,-0.638 ; -0.711,-1.206 -0.638,-1.133 ; 0,-3.931 0,-3.55 ; 0.302,2.012 3.508,2.012 ; 0.638,1.133 0.711,1.206 ; 1.133,0.638 1.206,0.711 ; 2.604,-0.711 2.677,-0.638 ; 3.099,-1.206 3.172,-1.133 ; 3.81,-3.931 3.81,-3.55 ; 4.112,2.012 7.318,2.012 ; 4.448,1.133 4.521,1.206 ; 4.943,0.638 5.016,0.711 ; 6.414,-0.711 6.487,-0.638 ; 6.909,-1.206 6.982,-1.133 ; 7.62,-3.931 7.62,-3.55 ; 7.922,2.012 11.128,2.012 ; 8.258,1.133 8.331,1.206 ; 8.753,0.638 8.826,0.711 ; 10.224,-0.711 10.297,-0.638 ; 10.719,-1.206 10.792,-1.133 ; 11.43,-3.931 11.43,-3.55 ; 11.732,2.012 13.335,2.012 ; 12.068,1.133 12.141,1.206 ; 12.563,0.638 12.636,0.711 ; -13.335,-3.55 13.335,-3.55 13.335,3.75 -13.335,3.75 -13.335,-3.55 ; -11.731,1.973 cw(c-11.43,1.998) -11.129,1.973 cw(c-11.43,2.148) -11.731,1.973 ; -7.921,1.973 cw(c-7.62,1.998) -7.319,1.973 cw(c-7.62,2.148) -7.921,1.973 ; -4.111,1.973 cw(c-3.81,1.998) -3.509,1.973 cw(c-3.81,2.148) -4.111,1.973 ; -0.301,1.973 cw(c0,1.998) 0.301,1.973 cw(c0,2.148) -0.301,1.973 ; 3.509,1.973 cw(c3.81,1.998) 4.111,1.973 cw(c3.81,2.148) 3.509,1.973 ; 7.319,1.973 cw(c7.62,1.998) 7.921,1.973 cw(c7.62,2.148) 7.319,1.973 ; 11.129,1.973 cw(c11.43,1.998) 11.731,1.973 cw(c11.43,2.148) 11.129,1.973
  text "1" at -11.64,2.575 h1
  text "2" at -7.83,2.575 h1
  text "3" at -4.02,2.575 h1
  text "4" at -0.21,2.575 h1
  text "5" at 3.6,2.575 h1
  text "6" at 7.41,2.575 h1
  text "7" at 11.22,2.575 h1
Mechanical 8:
  lines w0.1: -11.93,0 -11.43,0 ; -11.43,-0.5 -11.43,0 ; -11.43,0.5 -11.43,0 ; -10.93,0 -11.43,0 ; -8.12,0 -7.62,0 ; -7.62,-0.5 -7.62,0 ; -7.62,0.5 -7.62,0 ; -7.12,0 -7.62,0 ; -4.31,0 -3.81,0 ; -3.81,-0.5 -3.81,0 ; -3.81,0.5 -3.81,0 ; -3.31,0 -3.81,0 ; 3.31,0 3.81,0 ; 3.81,-0.5 3.81,0 ; 3.81,0.5 3.81,0 ; 4.31,0 3.81,0 ; 7.12,0 7.62,0 ; 7.62,-0.5 7.62,0 ; 7.62,0.5 7.62,0 ; 8.12,0 7.62,0 ; 10.93,0 11.43,0 ; 11.43,-0.5 11.43,0 ; 11.43,0.5 11.43,0 ; 11.93,0 11.43,0 ; 0,0 0,0.5 0,0 ; 0,0 0.5,0 0,0 ; 0,0 0,-0.5 0,0 ; 0,0 -0.5,0 0,0
Mechanical 14:
  circle w0.1: c-11.43,0 r1.45
  circle w0.1: c-11.43,0 r1.4
  circle w0.1: c-7.62,0 r1.45
  circle w0.1: c-7.62,0 r1.4
  circle w0.1: c-3.81,0 r1.45
  circle w0.1: c-3.81,0 r1.4
  circle w0.1: c0,0 r1.45
  circle w0.1: c0,0 r1.4
  circle w0.1: c3.81,0 r1.45
  circle w0.1: c3.81,0 r1.4
  circle w0.1: c7.62,0 r1.45
  circle w0.1: c7.62,0 r1.4
  circle w0.1: c11.43,0 r1.45
  circle w0.1: c11.43,0 r1.4
  lines w0.1: -13.335,-3.25 13.335,-3.25 ; -13.335,-2.811 13.335,-2.811 ; -13.335,-1.999 13.335,-1.999 ; -13.335,-1.516 13.335,-1.516 ; -13.335,1.537 13.335,1.537 ; -13.335,2.012 -11.732,2.012 ; -12.636,-0.711 -10.719,1.206 ; -12.141,-1.206 -10.224,0.711 ; -11.43,-3.931 -11.43,-3.55 ; -11.128,2.012 -7.922,2.012 ; -8.826,-0.711 -6.909,1.206 ; -8.331,-1.206 -6.414,0.711 ; -7.62,-3.931 -7.62,-3.55 ; -7.318,2.012 -4.112,2.012 ; -5.016,-0.711 -3.099,1.206 ; -4.521,-1.206 -2.604,0.711 ; -3.81,-3.931 -3.81,-3.55 ; -3.508,2.012 -0.302,2.012 ; -1.206,-0.711 0.711,1.206 ; -0.711,-1.206 1.206,0.711 ; 0,-3.931 0,-3.55 ; 0.302,2.012 3.508,2.012 ; 2.604,-0.711 4.521,1.206 ; 3.099,-1.206 5.016,0.711 ; 3.81,-3.931 3.81,-3.55 ; 4.112,2.012 7.318,2.012 ; 6.414,-0.711 8.331,1.206 ; 6.909,-1.206 8.826,0.711 ; 7.62,-3.931 7.62,-3.55 ; 7.922,2.012 11.128,2.012 ; 10.224,-0.711 12.141,1.206 ; 10.719,-1.206 12.636,0.711 ; 11.43,-3.931 11.43,-3.55 ; 11.732,2.012 13.335,2.012 ; -13.335,-3.55 13.335,-3.55 13.335,3.75 -13.335,3.75 -13.335,-3.55 ; -11.731,1.973 cw(c-11.43,1.998) -11.129,1.973 cw(c-11.43,2.148) -11.731,1.973 ; -7.921,1.973 cw(c-7.62,1.998) -7.319,1.973 cw(c-7.62,2.148) -7.921,1.973 ; -4.111,1.973 cw(c-3.81,1.998) -3.509,1.973 cw(c-3.81,2.148) -4.111,1.973 ; -0.301,1.973 cw(c0,1.998) 0.301,1.973 cw(c0,2.148) -0.301,1.973 ; 3.509,1.973 cw(c3.81,1.998) 4.111,1.973 cw(c3.81,2.148) 3.509,1.973 ; 7.319,1.973 cw(c7.62,1.998) 7.921,1.973 cw(c7.62,2.148) 7.319,1.973 ; 11.129,1.973 cw(c11.43,1.998) 11.731,1.973 cw(c11.43,2.148) 11.129,1.973
  text "1" at -11.64,2.575 h1
  text "2" at -7.83,2.575 h1
  text "3" at -4.02,2.575 h1
  text "4" at -0.21,2.575 h1
  text "5" at 3.6,2.575 h1
  text "6" at 7.41,2.575 h1
  text "7" at 11.22,2.575 h1
3D body "PHOENIX_1727065.stp": height 8.5, standoff -3.5, extent -13.335,-3.6 13.335,3.7

## WJ500V5.08 2P [mm] "Terminal Block, 17.5A 400V, Pitch 5.08mm, 2 Positions, Screw Connection"
height 13.8
pads (2):
  round 2 hole 1.3: 1(-2.54,0) 2(2.54,0)
Top Overlay:
  circle w0.2: c2.54,-0.2 r2
  circle w0.2: c-2.54,-0.2 r2
  circle w0.2: c0,1.1 r0.5
  lines w0.2: -5.08,-4.1 5.08,-4.1 ; -5.08,-3.869 -5.247,-3.869 -5.479,-4.064 -5.821,-4.064 -5.821,-3.136 -5.479,-3.136 -5.247,-3.331 -5.08,-3.331 ; -5.08,-2.672 5.08,-2.672 ; -5.08,-2.283 5.08,-2.283 ; -5.08,1.909 5.08,1.909 ; -5.08,2.29 5.08,2.29 ; -5.08,-4.6 -5.08,5.2 5.08,5.2 5.08,-4.6 -5.08,-4.6
  text "1" at -2.699,2.857 h1
  text "2" at 2.222,2.857 h1
Mechanical 8:
  lines w0.1: -3.04,0 -2.54,0 ; -2.54,-0.5 -2.54,0 ; -2.54,0.5 -2.54,0 ; -2.04,0 -2.54,0 ; -0.5,0 0,0 ; 0,-0.5 0,0 ; 0,0.5 0,0 ; 0.5,0 0,0 ; 2.04,0 2.54,0 ; 2.54,-0.5 2.54,0 ; 2.54,0.5 2.54,0 ; 3.04,0 2.54,0
Mechanical 14:
  circle w0.1: c-2.54,-0.2 r1.891
  circle w0.1: c2.54,-0.2 r1.891
  circle w0.1: c0,1.1 r0.5
  circle w0.1: c-2.54,-0.2 r2
  circle w0.1: c2.54,-0.2 r2
  lines w0.1: -5.08,-4.1 5.08,-4.1 ; -5.08,-3.869 -5.247,-3.869 -5.479,-4.064 -5.821,-4.064 -5.821,-3.136 -5.479,-3.136 -5.247,-3.331 -5.08,-3.331 ; -5.08,-2.672 5.08,-2.672 ; -5.08,-2.283 5.08,-2.283 ; -5.08,1.909 5.08,1.909 ; -5.08,2.29 5.08,2.29 ; -4.043,-1.349 -1.391,1.303 ; -3.689,-1.703 -1.037,0.949 ; 1.037,-1.349 3.689,1.303 ; 1.391,-1.703 4.043,0.949 ; -5.08,-4.6 5.08,-4.6 5.08,5.2 -5.08,5.2 -5.08,-4.6
  text "1" at -2.699,2.857 h1
  text "2" at 2.222,2.857 h1
3D body "PHOENIX_1715721.stp": height 14.19, standoff -3.5, extent -5.821,-4.6 5.08,5.2

## WJ500V5.08 3P [mm] "Terminal Block, 17.5A 400V, Pitch 5.08mm, 3 Positions, Screw Connection"
height 13.8
pads (3):
  round 2 hole 1.3: 1(-5.08,0) 2(0,0) 3(5.08,0)
Top Overlay:
  circle w0.2: c5.08,-0.2 r2
  circle w0.2: c0,-0.2 r2
  circle w0.2: c-5.08,-0.2 r2
  circle w0.2: c2.54,1.1 r0.5
  circle w0.2: c-2.54,1.1 r0.5
  lines w0.2: -7.62,-4.1 7.62,-4.1 ; -7.62,-3.869 -7.787,-3.869 -8.019,-4.064 -8.361,-4.064 -8.361,-3.136 -8.019,-3.136 -7.787,-3.331 -7.62,-3.331 ; -7.62,-2.672 7.62,-2.672 ; -7.62,-2.283 7.62,-2.283 ; -7.62,1.909 7.62,1.909 ; -7.62,2.29 7.62,2.29 ; -7.62,-4.6 -7.62,5.2 7.62,5.2 7.62,-4.6 -7.62,-4.6
  text "3" at 4.763,2.857 h1
  text "2" at -0.318,2.857 h1
  text "1" at -5.239,2.857 h1
Mechanical 8:
  lines w0.1: -5.58,0 -5.08,0 ; -5.08,-0.5 -5.08,0 ; -5.08,0.5 -5.08,0 ; -4.58,0 -5.08,0 ; -0.5,0 0,0 ; 0,-0.5 0,0 ; 0,0.5 0,0 ; 0.5,0 0,0 ; 4.58,0 5.08,0 ; 5.08,-0.5 5.08,0 ; 5.08,0.5 5.08,0 ; 5.58,0 5.08,0
Mechanical 14:
  circle w0.1: c-5.08,-0.2 r1.891
  circle w0.1: c0,-0.2 r1.891
  circle w0.1: c5.08,-0.2 r1.891
  circle w0.1: c-2.54,1.1 r0.5
  circle w0.1: c2.54,1.1 r0.5
  circle w0.1: c-5.08,-0.2 r2
  circle w0.1: c0,-0.2 r2
  circle w0.1: c5.08,-0.2 r2
  lines w0.1: -7.62,-4.1 7.62,-4.1 ; -7.62,-3.869 -7.787,-3.869 -8.019,-4.064 -8.361,-4.064 -8.361,-3.136 -8.019,-3.136 -7.787,-3.331 -7.62,-3.331 ; -7.62,-2.672 7.62,-2.672 ; -7.62,-2.283 7.62,-2.283 ; -7.62,1.909 7.62,1.909 ; -7.62,2.29 7.62,2.29 ; -6.583,-1.349 -3.931,1.303 ; -6.229,-1.703 -3.577,0.949 ; -1.503,-1.349 1.149,1.303 ; -1.149,-1.703 1.503,0.949 ; 3.577,-1.349 6.229,1.303 ; 3.931,-1.703 6.583,0.949 ; -7.62,-4.6 7.62,-4.6 7.62,5.2 -7.62,5.2 -7.62,-4.6
  text "3" at 4.763,2.857 h1
  text "2" at -0.318,2.857 h1
  text "1" at -5.239,2.857 h1
3D body "PHOENIX_1715734.stp": height 14.19, standoff -3.5, extent -8.361,-4.6 7.62,5.2

## WJ500V5.08 4P [mm] "Terminal Block, 17.5A 400V, Pitch 5.08mm, 4 Positions, Screw Connection"
height 13.8
pads (4):
  round 2 hole 1.3: 1(-7.62,0) 2(-2.54,0) 3(2.54,0) 4(7.62,0)
Top Overlay:
  circle w0.2: c-7.62,-0.2 r2
  circle w0.2: c-2.54,-0.2 r2
  circle w0.2: c2.54,-0.2 r2
  circle w0.2: c7.62,-0.2 r2
  circle w0.2: c-5.08,1.1 r0.49
  circle w0.2: c0,1.1 r0.49
  circle w0.2: c5.08,1.1 r0.49
  lines w0.2: -10.16,-4.1 10.16,-4.1 ; -10.16,-3.869 -10.327,-3.869 -10.559,-4.064 -10.901,-4.064 -10.901,-3.136 -10.559,-3.136 -10.327,-3.331 -10.16,-3.331 ; -10.16,-2.672 10.16,-2.672 ; -10.16,-2.283 10.16,-2.283 ; -10.16,1.909 10.16,1.909 ; -10.16,2.29 10.16,2.29 ; -10.16,-4.6 -10.16,5.2 10.16,5.2 10.16,-4.6 -10.16,-4.6
  text "4" at 7.302,2.857 h1
  text "3" at 2.222,2.857 h1
  text "2" at -2.857,2.857 h1
  text "1" at -7.779,2.857 h1
Mechanical 8:
  lines w0.1: -8.12,0 -7.62,0 ; -7.62,-0.5 -7.62,0 ; -7.62,0.5 -7.62,0 ; -7.12,0 -7.62,0 ; -3.04,0 -2.54,0 ; -2.54,-0.5 -2.54,0 ; -2.54,0.5 -2.54,0 ; -2.04,0 -2.54,0 ; 2.04,0 2.54,0 ; 2.54,-0.5 2.54,0 ; 2.54,0.5 2.54,0 ; 3.04,0 2.54,0 ; 7.12,0 7.62,0 ; 7.62,-0.5 7.62,0 ; 7.62,0.5 7.62,0 ; 8.12,0 7.62,0 ; 10.16,-3.869 9.993,-3.869 9.761,-4.064 9.419,-4.064 9.419,-3.136 9.761,-3.136 9.993,-3.331 10.16,-3.331
Mechanical 14:
  circle w0.1: c5.08,1.1 r0.49
  circle w0.1: c0,1.1 r0.49
  circle w0.1: c-5.08,1.1 r0.49
  circle w0.1: c7.62,-0.2 r2
  circle w0.1: c7.62,-0.2 r1.891
  circle w0.1: c2.54,-0.2 r2
  circle w0.1: c2.54,-0.2 r1.891
  circle w0.1: c-2.54,-0.2 r2
  circle w0.1: c-2.54,-0.2 r1.891
  circle w0.1: c-7.62,-0.2 r2
  circle w0.1: c-7.62,-0.2 r1.891
  lines w0.1: -10.16,-4.1 10.16,-4.1 ; -10.16,-3.869 -10.327,-3.869 -10.559,-4.064 -10.901,-4.064 -10.901,-3.136 -10.559,-3.136 -10.327,-3.331 -10.16,-3.331 ; -10.16,-2.672 10.16,-2.672 ; -10.16,-2.283 10.16,-2.283 ; -10.16,1.909 10.16,1.909 ; -10.16,2.29 10.16,2.29 ; -9.182,-1.267 -6.553,1.362 ; -8.687,-1.762 -6.058,0.867 ; -4.102,-1.267 -1.473,1.362 ; -3.607,-1.762 -0.978,0.867 ; 0.978,-1.267 3.607,1.362 ; 1.473,-1.762 4.102,0.867 ; 6.058,-1.267 8.687,1.362 ; 6.553,-1.762 9.182,0.867 ; -10.16,-4.6 10.16,-4.6 10.16,5.2 -10.16,5.2 -10.16,-4.6
  text "4" at 7.302,2.857 h1
  text "3" at 2.222,2.857 h1
  text "2" at -2.857,2.857 h1
  text "1" at -7.779,2.857 h1
3D body "PHOENIX_1715747.stp": height 14.2, standoff -3.5, extent -10.901,-4.6 10.16,5.2

## WLCSP8 [mm]
pads (8):
  round 0.25 smd mask+0.051: A1(-0.5,-0.5) A2(-0.5,0) A3(-0.5,0.5) B1(0,-0.5) B3(0,0.5) C1(0.5,-0.5) C2(0.5,0) C3(0.5,0.5)
Top Overlay:
  circle w0.152: c-0.6,-1.125 r0.076
  lines w0.152: -0.86,-0.4 -0.86,-0.86 -0.4,-0.86 ; -0.86,0.4 -0.86,0.86 -0.4,0.86 ; 0.4,-0.86 0.86,-0.86 0.86,-0.4 ; 0.4,0.86 0.86,0.86 0.86,0.4
Mechanical 13:
  lines w0.05: -0.75,-0.3 -0.3,-0.3 -0.3,-0.75 ; -0.75,-0.75 -0.75,0.75 0.75,0.75 0.75,-0.75 -0.75,-0.75

## WOB [mm]
pads (4):
  rect 1.6x1.6 hole 1.1: 1(-2.54,2.54)
  round 1.6 hole 1.1: 2(-2.54,-2.54) 3(2.54,-2.54) 4(2.54,2.54)
Top Overlay:
  circle w0.254: c0,0 r5
  lines w0.203: -4.8,-3.9 -3.8,-3.9 ; -4.3,-4.4 -4.3,-3.4 ; -3.1,1.1 ccw(c-2.8,1.1) -2.5,1.1 cw(c-2.2,1.1) -1.9,1.1 ; -3,-0.9 -2,-0.9 ; -2.5,-1.4 -2.5,-0.4 ; 1.9,-1.1 ccw(c2.2,-1.1) 2.5,-1.1 cw(c2.8,-1.1) 3.1,-1.1 ; 2.1,1.3 3.1,1.3 ; 3.4,4.3 4.4,4.3
Mechanical 13:
  circle w0.1: c0,0 r4.65